# Altium footprint library 4.49-接插件.PcbLib: 260 footprints (part 3 of 17)
Each footprint in its own frame and in the unit in brackets; x right, y up, seen from the top. Pads: shape width x height; smd on the part's side, far side on the other; paste and mask are expansions set on the pad; w line width, h text height; cw(c..) or ccw(c..) is an arc to the next point about the centre after c.
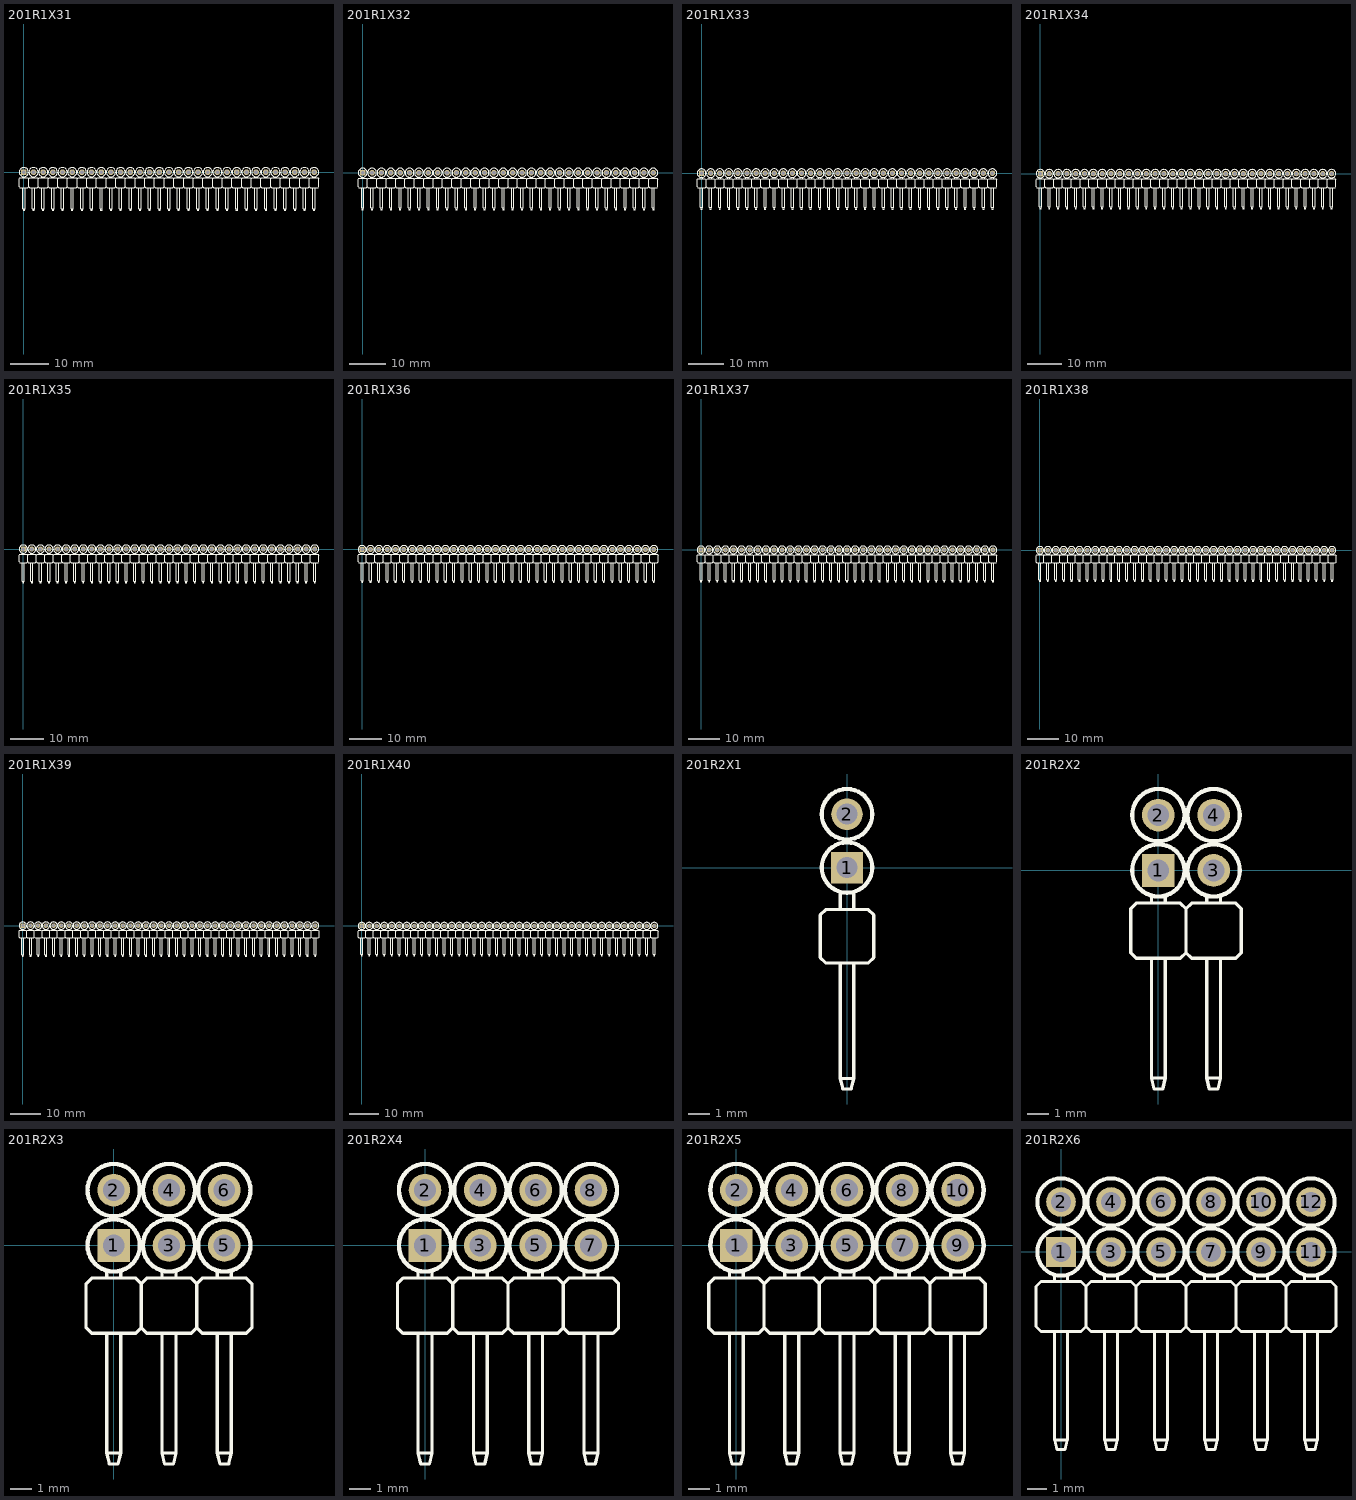
[diagram p2: the footprints below, top view; thin cyan lines are the x and y axes]

## 201R1X31 [mm]
pads (31):
  rect 1.5x1.5 hole 1: 1(0,0)
  round 1.5 hole 1: 2(2.54,0) 3(5.08,0) 4(7.62,0) 5(10.16,0) 6(12.7,0) 7(15.24,0) 8(17.78,0) 9(20.32,0) 10(22.86,0) 11(25.4,0) 12(27.94,0) 13(30.48,0) 14(33.02,0) 15(35.56,0) 16(38.1,0) 17(40.64,0) 18(43.18,0) 19(45.72,0) 20(48.26,0) 21(50.8,0) 22(53.34,0) 23(55.88,0) 24(58.42,0) 25(60.96,0) 26(63.5,0) 27(66.04,0) 28(68.58,0) 29(71.12,0) 30(73.66,0) 31(76.2,0)
Top Overlay:
  drawing of 497 lines, arcs and shapes, not listed
3D body "201R31.STEP": height 2.54, standoff -1.73, extent -1.27,-10 77.47,0.315

## 201R1X32 [mm]
pads (32):
  rect 1.5x1.5 hole 1: 1(0,0)
  round 1.5 hole 1: 2(2.54,0) 3(5.08,0) 4(7.62,0) 5(10.16,0) 6(12.7,0) 7(15.24,0) 8(17.78,0) 9(20.32,0) 10(22.86,0) 11(25.4,0) 12(27.94,0) 13(30.48,0) 14(33.02,0) 15(35.56,0) 16(38.1,0) 17(40.64,0) 18(43.18,0) 19(45.72,0) 20(48.26,0) 21(50.8,0) 22(53.34,0) 23(55.88,0) 24(58.42,0) 25(60.96,0) 26(63.5,0) 27(66.04,0) 28(68.58,0) 29(71.12,0) 30(73.66,0) 31(76.2,0) 32(78.74,0)
Top Overlay:
  drawing of 513 lines, arcs and shapes, not listed
3D body "201R32.STEP": height 2.54, standoff -1.73, extent -1.27,-10 80.01,0.315

## 201R1X33 [mm]
pads (33):
  rect 1.5x1.5 hole 1: 1(0,0)
  round 1.5 hole 1: 2(2.54,0) 3(5.08,0) 4(7.62,0) 5(10.16,0) 6(12.7,0) 7(15.24,0) 8(17.78,0) 9(20.32,0) 10(22.86,0) 11(25.4,0) 12(27.94,0) 13(30.48,0) 14(33.02,0) 15(35.56,0) 16(38.1,0) 17(40.64,0) 18(43.18,0) 19(45.72,0) 20(48.26,0) 21(50.8,0) 22(53.34,0) 23(55.88,0) 24(58.42,0) 25(60.96,0) 26(63.5,0) 27(66.04,0) 28(68.58,0) 29(71.12,0) 30(73.66,0) 31(76.2,0) 32(78.74,0) 33(81.28,0)
Top Overlay:
  drawing of 529 lines, arcs and shapes, not listed
3D body "201R33.STEP": height 2.54, standoff -1.73, extent -1.27,-10 82.55,0.315

## 201R1X34 [mm]
pads (34):
  rect 1.5x1.5 hole 1: 1(0,0)
  round 1.5 hole 1: 2(2.54,0) 3(5.08,0) 4(7.62,0) 5(10.16,0) 6(12.7,0) 7(15.24,0) 8(17.78,0) 9(20.32,0) 10(22.86,0) 11(25.4,0) 12(27.94,0) 13(30.48,0) 14(33.02,0) 15(35.56,0) 16(38.1,0) 17(40.64,0) 18(43.18,0) 19(45.72,0) 20(48.26,0) 21(50.8,0) 22(53.34,0) 23(55.88,0) 24(58.42,0) 25(60.96,0) 26(63.5,0) 27(66.04,0) 28(68.58,0) 29(71.12,0) 30(73.66,0) 31(76.2,0) 32(78.74,0) 33(81.28,0) 34(83.82,0)
Top Overlay:
  drawing of 545 lines, arcs and shapes, not listed
3D body "201R34.STEP": height 2.54, standoff -1.73, extent -1.27,-10 85.09,0.315

## 201R1X35 [mm]
pads (35):
  rect 1.5x1.5 hole 1: 1(0,0)
  round 1.5 hole 1: 2(2.54,0) 3(5.08,0) 4(7.62,0) 5(10.16,0) 6(12.7,0) 7(15.24,0) 8(17.78,0) 9(20.32,0) 10(22.86,0) 11(25.4,0) 12(27.94,0) 13(30.48,0) 14(33.02,0) 15(35.56,0) 16(38.1,0) 17(40.64,0) 18(43.18,0) 19(45.72,0) 20(48.26,0) 21(50.8,0) 22(53.34,0) 23(55.88,0) 24(58.42,0) 25(60.96,0) 26(63.5,0) 27(66.04,0) 28(68.58,0) 29(71.12,0) 30(73.66,0) 31(76.2,0) 32(78.74,0) 33(81.28,0) 34(83.82,0) 35(86.36,0)
Top Overlay:
  drawing of 561 lines, arcs and shapes, not listed
3D body "201R35.STEP": height 2.54, standoff -1.73, extent -1.27,-10 87.63,0.315

## 201R1X36 [mm]
pads (36):
  rect 1.5x1.5 hole 1: 1(0,0)
  round 1.5 hole 1: 2(2.54,0) 3(5.08,0) 4(7.62,0) 5(10.16,0) 6(12.7,0) 7(15.24,0) 8(17.78,0) 9(20.32,0) 10(22.86,0) 11(25.4,0) 12(27.94,0) 13(30.48,0) 14(33.02,0) 15(35.56,0) 16(38.1,0) 17(40.64,0) 18(43.18,0) 19(45.72,0) 20(48.26,0) 21(50.8,0) 22(53.34,0) 23(55.88,0) 24(58.42,0) 25(60.96,0) 26(63.5,0) 27(66.04,0) 28(68.58,0) 29(71.12,0) 30(73.66,0) 31(76.2,0) 32(78.74,0) 33(81.28,0) 34(83.82,0) 35(86.36,0) 36(88.9,0)
Top Overlay:
  drawing of 577 lines, arcs and shapes, not listed
3D body "201R36.STEP": height 2.54, standoff -1.73, extent -1.27,-10 90.17,0.315

## 201R1X37 [mm]
pads (37):
  rect 1.5x1.5 hole 1: 1(0,0)
  round 1.5 hole 1: 2(2.54,0) 3(5.08,0) 4(7.62,0) 5(10.16,0) 6(12.7,0) 7(15.24,0) 8(17.78,0) 9(20.32,0) 10(22.86,0) 11(25.4,0) 12(27.94,0) 13(30.48,0) 14(33.02,0) 15(35.56,0) 16(38.1,0) 17(40.64,0) 18(43.18,0) 19(45.72,0) 20(48.26,0) 21(50.8,0) 22(53.34,0) 23(55.88,0) 24(58.42,0) 25(60.96,0) 26(63.5,0) 27(66.04,0) 28(68.58,0) 29(71.12,0) 30(73.66,0) 31(76.2,0) 32(78.74,0) 33(81.28,0) 34(83.82,0) 35(86.36,0) 36(88.9,0) 37(91.44,0)
Top Overlay:
  drawing of 593 lines, arcs and shapes, not listed
3D body "201R37.STEP": height 2.54, standoff -1.73, extent -1.27,-10 92.71,0.315

## 201R1X38 [mm]
pads (38):
  rect 1.5x1.5 hole 1: 1(0,0)
  round 1.5 hole 1: 2(2.54,0) 3(5.08,0) 4(7.62,0) 5(10.16,0) 6(12.7,0) 7(15.24,0) 8(17.78,0) 9(20.32,0) 10(22.86,0) 11(25.4,0) 12(27.94,0) 13(30.48,0) 14(33.02,0) 15(35.56,0) 16(38.1,0) 17(40.64,0) 18(43.18,0) 19(45.72,0) 20(48.26,0) 21(50.8,0) 22(53.34,0) 23(55.88,0) 24(58.42,0) 25(60.96,0) 26(63.5,0) 27(66.04,0) 28(68.58,0) 29(71.12,0) 30(73.66,0) 31(76.2,0) 32(78.74,0) 33(81.28,0) 34(83.82,0) 35(86.36,0) 36(88.9,0) 37(91.44,0) 38(93.98,0)
Top Overlay:
  drawing of 609 lines, arcs and shapes, not listed
3D body "201R38.STEP": height 2.54, standoff -1.73, extent -1.27,-10 95.25,0.315

## 201R1X39 [mm]
pads (39):
  rect 1.5x1.5 hole 1: 1(0,0)
  round 1.5 hole 1: 2(2.54,0) 3(5.08,0) 4(7.62,0) 5(10.16,0) 6(12.7,0) 7(15.24,0) 8(17.78,0) 9(20.32,0) 10(22.86,0) 11(25.4,0) 12(27.94,0) 13(30.48,0) 14(33.02,0) 15(35.56,0) 16(38.1,0) 17(40.64,0) 18(43.18,0) 19(45.72,0) 20(48.26,0) 21(50.8,0) 22(53.34,0) 23(55.88,0) 24(58.42,0) 25(60.96,0) 26(63.5,0) 27(66.04,0) 28(68.58,0) 29(71.12,0) 30(73.66,0) 31(76.2,0) 32(78.74,0) 33(81.28,0) 34(83.82,0) 35(86.36,0) 36(88.9,0) 37(91.44,0) 38(93.98,0) 39(96.52,0)
Top Overlay:
  drawing of 625 lines, arcs and shapes, not listed
3D body "201R39.STEP": height 2.54, standoff -1.73, extent -1.27,-10 97.79,0.315

## 201R1X40 [mm]
pads (40):
  rect 1.5x1.5 hole 1: 1(0,0)
  round 1.5 hole 1: 2(2.54,0) 3(5.08,0) 4(7.62,0) 5(10.16,0) 6(12.7,0) 7(15.24,0) 8(17.78,0) 9(20.32,0) 10(22.86,0) 11(25.4,0) 12(27.94,0) 13(30.48,0) 14(33.02,0) 15(35.56,0) 16(38.1,0) 17(40.64,0) 18(43.18,0) 19(45.72,0) 20(48.26,0) 21(50.8,0) 22(53.34,0) 23(55.88,0) 24(58.42,0) 25(60.96,0) 26(63.5,0) 27(66.04,0) 28(68.58,0) 29(71.12,0) 30(73.66,0) 31(76.2,0) 32(78.74,0) 33(81.28,0) 34(83.82,0) 35(86.36,0) 36(88.9,0) 37(91.44,0) 38(93.98,0) 39(96.52,0) 40(99.06,0)
Top Overlay:
  drawing of 732 lines, arcs and shapes, not listed
3D body "201R40.STEP": height 2.54, standoff -1.73, extent -1.27,-10 100.33,0.315

## 201R2X1 [mm]
pads (2):
  rect 1.5x1.5 hole 1: 1(0,0)
  round 1.5 hole 1: 2(0,2.54)
Top Overlay:
  circle w0.2: c0,2.54 r1.2
  circle w0.2: c0,0 r1.2
  lines w0.15: -0.32,-4.55 -0.32,-10.04 ; -0.32,-1.99 -0.32,-1.27 ; 0.32,-4.55 0.32,-10.04 ; 0.32,-1.99 0.32,-1.27 ; -0.32,-10.04 0.32,-10.04 ; -0.32,-10.04 -0.2,-10.54 0.2,-10.54 0.32,-10.04 ; -1.27,-4.286 -1.016,-4.54 1.016,-4.54 1.27,-4.286 1.27,-2.254 1.016,-2 -1.016,-2 -1.27,-2.254 -1.27,-4.286
3D body "Samtec-1.step": height 5.08, standoff -6.6, extent -1.252,-11.179 1.288,2.855

## 201R2X2 [mm]
pads (4):
  rect 1.5x1.5 hole 1: 1(0,0)
  round 1.5 hole 1: 2(0,2.54) 3(2.54,0) 4(2.54,2.54)
Top Overlay:
  circle w0.2: c2.54,2.54 r1.2
  circle w0.2: c0,2.54 r1.2
  circle w0.2: c0,0 r1.2
  circle w0.2: c2.54,0 r1.2
  lines w0.15: -0.32,-4.05 -0.32,-9.54 ; -0.32,-1.5 -0.32,-1.27 ; 0.32,-4.05 0.32,-9.54 ; 0.32,-1.5 0.32,-1.27 ; 2.22,-4.05 2.22,-9.54 ; 2.22,-1.5 2.22,-1.27 ; 2.86,-4.05 2.86,-9.54 ; 2.86,-1.5 2.86,-1.27 ; -0.32,-9.54 0.32,-9.54 ; -0.32,-9.54 -0.2,-10.04 0.2,-10.04 0.32,-9.54 ; 1.27,-3.786 1.27,-1.754 ; 1.27,-3.786 1.524,-4.04 3.556,-4.04 3.81,-3.786 3.81,-1.754 3.556,-1.5 1.524,-1.5 1.27,-1.754 ; 1.27,-3.786 1.016,-4.04 -1.016,-4.04 -1.27,-3.786 -1.27,-1.754 -1.016,-1.5 1.016,-1.5 1.27,-1.754 ; 2.22,-9.54 2.34,-10.04 2.74,-10.04 2.86,-9.54 ; 2.22,-9.54 2.86,-9.54
3D body "201R2.STEP": height 5.08, standoff -1.73, extent -1.27,-10 3.81,2.855

## 201R2X3 [mm]
pads (6):
  rect 1.5x1.5 hole 1: 1(0,0)
  round 1.5 hole 1: 2(0,2.54) 3(2.54,0) 4(2.54,2.54) 5(5.08,0) 6(5.08,2.54)
Top Overlay:
  circle w0.2: c2.54,2.54 r1.2
  circle w0.2: c0,2.54 r1.2
  circle w0.2: c0,0 r1.2
  circle w0.2: c2.54,0 r1.2
  circle w0.2: c5.08,0 r1.2
  circle w0.2: c5.08,2.54 r1.2
  lines w0.15: -0.32,-4.05 -0.32,-9.54 ; -0.32,-1.5 -0.32,-1.27 ; 0.32,-4.05 0.32,-9.54 ; 0.32,-1.5 0.32,-1.27 ; 2.22,-4.05 2.22,-9.54 ; 2.22,-1.5 2.22,-1.27 ; 2.86,-4.05 2.86,-9.54 ; 2.86,-1.5 2.86,-1.27 ; 4.76,-4.05 4.76,-9.54 ; 4.76,-1.5 4.76,-1.27 ; 5.4,-4.05 5.4,-9.54 ; 5.4,-1.5 5.4,-1.27 ; -0.32,-9.54 0.32,-9.54 ; -0.32,-9.54 -0.2,-10.04 0.2,-10.04 0.32,-9.54 ; 1.27,-3.786 1.27,-1.754 ; 1.27,-3.786 1.524,-4.04 3.556,-4.04 3.81,-3.786 ; 1.27,-3.786 1.016,-4.04 -1.016,-4.04 -1.27,-3.786 -1.27,-1.754 -1.016,-1.5 1.016,-1.5 1.27,-1.754 ; 1.27,-1.754 1.524,-1.5 3.556,-1.5 3.81,-1.754 ; 2.22,-9.54 2.34,-10.04 2.74,-10.04 2.86,-9.54 ; 2.22,-9.54 2.86,-9.54 ; 3.81,-3.786 4.064,-4.04 6.096,-4.04 6.35,-3.786 6.35,-1.754 6.096,-1.5 4.064,-1.5 3.81,-1.754 ; 3.81,-3.786 3.81,-1.754 ; 4.76,-9.54 5.4,-9.54 ; 4.76,-9.54 4.88,-10.04 5.28,-10.04 5.4,-9.54
3D body "201R3.STEP": height 5.08, standoff -1.73, extent -1.27,-10 6.35,2.855

## 201R2X4 [mm]
pads (8):
  rect 1.5x1.5 hole 1: 1(0,0)
  round 1.5 hole 1: 2(0,2.54) 3(2.54,0) 4(2.54,2.54) 5(5.08,0) 6(5.08,2.54) 7(7.62,0) 8(7.62,2.54)
Top Overlay:
  circle w0.2: c7.62,2.54 r1.2
  circle w0.2: c2.54,2.54 r1.2
  circle w0.2: c0,2.54 r1.2
  circle w0.2: c5.08,2.54 r1.2
  circle w0.2: c5.08,0 r1.2
  circle w0.2: c0,0 r1.2
  circle w0.2: c2.54,0 r1.2
  circle w0.2: c7.62,0 r1.2
  lines w0.15: -0.32,-4.05 -0.32,-9.54 ; -0.32,-1.5 -0.32,-1.27 ; 0.32,-4.05 0.32,-9.54 ; 0.32,-1.5 0.32,-1.27 ; 2.22,-4.05 2.22,-9.54 ; 2.22,-1.5 2.22,-1.27 ; 2.86,-4.05 2.86,-9.54 ; 2.86,-1.5 2.86,-1.27 ; 4.76,-4.05 4.76,-9.54 ; 4.76,-1.5 4.76,-1.27 ; 5.4,-4.05 5.4,-9.54 ; 5.4,-1.5 5.4,-1.27 ; 7.3,-4.05 7.3,-9.54 ; 7.3,-1.5 7.3,-1.27 ; 7.94,-4.05 7.94,-9.54 ; 7.94,-1.5 7.94,-1.27 ; -0.32,-9.54 -0.2,-10.04 0.2,-10.04 0.32,-9.54 ; -0.32,-9.54 0.32,-9.54 ; 1.27,-3.786 1.016,-4.04 -1.016,-4.04 -1.27,-3.786 -1.27,-1.754 -1.016,-1.5 1.016,-1.5 1.27,-1.754 ; 1.27,-3.786 1.524,-4.04 3.556,-4.04 3.81,-3.786 ; 1.27,-3.786 1.27,-1.754 ; 1.27,-1.754 1.524,-1.5 3.556,-1.5 3.81,-1.754 ; 2.22,-9.54 2.86,-9.54 ; 2.22,-9.54 2.34,-10.04 2.74,-10.04 2.86,-9.54 ; 3.81,-3.786 3.81,-1.754 ; 3.81,-3.786 4.064,-4.04 6.096,-4.04 6.35,-3.786 ; 3.81,-1.754 4.064,-1.5 6.096,-1.5 6.35,-1.754 ; 4.76,-9.54 4.88,-10.04 5.28,-10.04 5.4,-9.54 ; 4.76,-9.54 5.4,-9.54 ; 6.35,-3.786 6.35,-1.754 ; 6.35,-3.786 6.604,-4.04 8.636,-4.04 8.89,-3.786 8.89,-1.754 8.636,-1.5 6.604,-1.5 6.35,-1.754 ; 7.3,-9.54 7.42,-10.04 7.82,-10.04 7.94,-9.54 ; 7.3,-9.54 7.94,-9.54
3D body "201R4.STEP": height 5.08, standoff -1.73, extent -1.27,-10 8.89,2.855

## 201R2X5 [mm]
pads (10):
  rect 1.5x1.5 hole 1: 1(0,0)
  round 1.5 hole 1: 2(0,2.54) 3(2.54,0) 4(2.54,2.54) 5(5.08,0) 6(5.08,2.54) 7(7.62,0) 8(7.62,2.54) 9(10.16,0) 10(10.16,2.54)
Top Overlay:
  circle w0.2: c7.62,2.54 r1.2
  circle w0.2: c2.54,2.54 r1.2
  circle w0.2: c0,2.54 r1.2
  circle w0.2: c5.08,2.54 r1.2
  circle w0.2: c5.08,0 r1.2
  circle w0.2: c0,0 r1.2
  circle w0.2: c2.54,0 r1.2
  circle w0.2: c7.62,0 r1.2
  circle w0.2: c10.16,0 r1.2
  circle w0.2: c10.16,2.54 r1.2
  lines w0.15: -0.32,-4.05 -0.32,-9.54 ; -0.32,-1.5 -0.32,-1.27 ; 0.32,-4.05 0.32,-9.54 ; 0.32,-1.5 0.32,-1.27 ; 2.22,-4.05 2.22,-9.54 ; 2.22,-1.5 2.22,-1.27 ; 2.86,-4.05 2.86,-9.54 ; 2.86,-1.5 2.86,-1.27 ; 4.76,-4.05 4.76,-9.54 ; 4.76,-1.5 4.76,-1.27 ; 5.4,-4.05 5.4,-9.54 ; 5.4,-1.5 5.4,-1.27 ; 7.3,-4.05 7.3,-9.54 ; 7.3,-1.5 7.3,-1.27 ; 7.94,-4.05 7.94,-9.54 ; 7.94,-1.5 7.94,-1.27 ; 9.84,-4.05 9.84,-9.54 ; 9.84,-1.5 9.84,-1.27 ; 10.48,-4.05 10.48,-9.54 ; 10.48,-1.5 10.48,-1.27 ; -0.32,-9.54 -0.2,-10.04 0.2,-10.04 0.32,-9.54 ; -0.32,-9.54 0.32,-9.54 ; 1.27,-3.786 1.016,-4.04 -1.016,-4.04 -1.27,-3.786 -1.27,-1.754 -1.016,-1.5 1.016,-1.5 1.27,-1.754 ; 1.27,-3.786 1.524,-4.04 3.556,-4.04 3.81,-3.786 ; 1.27,-3.786 1.27,-1.754 ; 1.27,-1.754 1.524,-1.5 3.556,-1.5 3.81,-1.754 ; 2.22,-9.54 2.86,-9.54 ; 2.22,-9.54 2.34,-10.04 2.74,-10.04 2.86,-9.54 ; 3.81,-3.786 3.81,-1.754 ; 3.81,-3.786 4.064,-4.04 6.096,-4.04 6.35,-3.786 ; 3.81,-1.754 4.064,-1.5 6.096,-1.5 6.35,-1.754 ; 4.76,-9.54 4.88,-10.04 5.28,-10.04 5.4,-9.54 ; 4.76,-9.54 5.4,-9.54 ; 6.35,-3.786 6.35,-1.754 ; 6.35,-3.786 6.604,-4.04 8.636,-4.04 8.89,-3.786 ; 6.35,-1.754 6.604,-1.5 8.636,-1.5 8.89,-1.754 ; 7.3,-9.54 7.42,-10.04 7.82,-10.04 7.94,-9.54 ; 7.3,-9.54 7.94,-9.54 ; 8.89,-3.786 9.144,-4.04 11.176,-4.04 11.43,-3.786 11.43,-1.754 11.176,-1.5 9.144,-1.5 8.89,-1.754 ; 8.89,-3.786 8.89,-1.754 ; 9.84,-9.54 9.96,-10.04 10.36,-10.04 10.48,-9.54 ; 9.84,-9.54 10.48,-9.54
3D body "201R5.STEP": height 5.08, standoff -1.73, extent -1.27,-10 11.43,2.855

## 201R2X6 [mm]
pads (12):
  rect 1.5x1.5 hole 1: 1(0,0)
  round 1.5 hole 1: 2(0,2.54) 3(2.54,0) 4(2.54,2.54) 5(5.08,0) 6(5.08,2.54) 7(7.62,0) 8(7.62,2.54) 9(10.16,0) 10(10.16,2.54) 11(12.7,0) 12(12.7,2.54)
Top Overlay:
  circle w0.2: c12.7,0 r1.2
  circle w0.2: c12.7,2.54 r1.2
  circle w0.2: c10.16,2.54 r1.2
  circle w0.2: c10.16,0 r1.2
  circle w0.2: c7.62,0 r1.2
  circle w0.2: c2.54,0 r1.2
  circle w0.2: c0,0 r1.2
  circle w0.2: c5.08,0 r1.2
  circle w0.2: c5.08,2.54 r1.2
  circle w0.2: c0,2.54 r1.2
  circle w0.2: c2.54,2.54 r1.2
  circle w0.2: c7.62,2.54 r1.2
  lines w0.15: -0.32,-4.05 -0.32,-9.54 ; -0.32,-1.5 -0.32,-1.27 ; 0.32,-4.05 0.32,-9.54 ; 0.32,-1.5 0.32,-1.27 ; 2.22,-4.05 2.22,-9.54 ; 2.22,-1.5 2.22,-1.27 ; 2.86,-4.05 2.86,-9.54 ; 2.86,-1.5 2.86,-1.27 ; 4.76,-4.05 4.76,-9.54 ; 4.76,-1.5 4.76,-1.27 ; 5.4,-4.05 5.4,-9.54 ; 5.4,-1.5 5.4,-1.27 ; 7.3,-4.05 7.3,-9.54 ; 7.3,-1.5 7.3,-1.27 ; 7.94,-4.05 7.94,-9.54 ; 7.94,-1.5 7.94,-1.27 ; 9.84,-4.05 9.84,-9.54 ; 9.84,-1.5 9.84,-1.27 ; 10.48,-4.05 10.48,-9.54 ; 10.48,-1.5 10.48,-1.27 ; 12.38,-4.05 12.38,-9.54 ; 12.38,-1.5 12.38,-1.27 ; 13.02,-4.05 13.02,-9.54 ; 13.02,-1.5 13.02,-1.27 ; -0.32,-9.54 0.32,-9.54 ; -0.32,-9.54 -0.2,-10.04 0.2,-10.04 0.32,-9.54 ; 1.27,-3.786 1.27,-1.754 ; 1.27,-3.786 1.524,-4.04 3.556,-4.04 3.81,-3.786 ; 1.27,-3.786 1.016,-4.04 -1.016,-4.04 -1.27,-3.786 -1.27,-1.754 -1.016,-1.5 1.016,-1.5 1.27,-1.754 ; 1.27,-1.754 1.524,-1.5 3.556,-1.5 3.81,-1.754 ; 2.22,-9.54 2.34,-10.04 2.74,-10.04 2.86,-9.54 ; 2.22,-9.54 2.86,-9.54 ; 3.81,-3.786 4.064,-4.04 6.096,-4.04 6.35,-3.786 ; 3.81,-3.786 3.81,-1.754 ; 3.81,-1.754 4.064,-1.5 6.096,-1.5 6.35,-1.754 ; 4.76,-9.54 5.4,-9.54 ; 4.76,-9.54 4.88,-10.04 5.28,-10.04 5.4,-9.54 ; 6.35,-3.786 6.35,-1.754 ; 6.35,-3.786 6.604,-4.04 8.636,-4.04 8.89,-3.786 ; 6.35,-3.786 6.35,-1.754 ; 6.35,-1.754 6.604,-1.5 8.636,-1.5 8.89,-1.754 ; 7.3,-9.54 7.94,-9.54 ; 7.3,-9.54 7.42,-10.04 7.82,-10.04 7.94,-9.54 ; 8.89,-3.786 8.89,-1.754 ; 8.89,-3.786 9.144,-4.04 11.176,-4.04 11.43,-3.786 ; 8.89,-1.754 9.144,-1.5 11.176,-1.5 11.43,-1.754 ; 9.84,-9.54 9.96,-10.04 10.36,-10.04 10.48,-9.54 ; 9.84,-9.54 10.48,-9.54 ; 11.43,-3.786 11.684,-4.04 13.716,-4.04 13.97,-3.786 13.97,-1.754 13.716,-1.5 11.684,-1.5 11.43,-1.754 ; 11.43,-3.786 11.43,-1.754 ; 12.38,-9.54 13.02,-9.54 ; 12.38,-9.54 12.5,-10.04 12.9,-10.04 13.02,-9.54
3D body "201R6.STEP": height 5.08, standoff -1.73, extent -1.27,-10 13.97,2.855